# Altium footprint library NXP_60_26022015.PCBLIB: 287 footprints (part 15 of 18) (continued)
## SOT1087-1 [mm] (continued)
  rectangle: 0.1,0.6 0.4,0.9
  rectangle: -0.4,0.1 -0.1,0.4
  rectangle: 0.1,0.1 0.4,0.4
  rectangle: -0.4,-0.4 -0.1,-0.1
  rectangle: 0.1,-0.4 0.4,-0.1
  rectangle: -0.4,-0.9 -0.1,-0.6
  rectangle: 0.1,-0.9 0.4,-0.6
  rectangle: -0.4,-1.4 -0.1,-1.1
  rectangle: 0.1,-1.4 0.4,-1.1
  rectangle: -0.4,-1.9 -0.1,-1.6
  rectangle: 0.1,-1.9 0.4,-1.6
  rectangle: -0.4,-2.4 -0.1,-2.1
  rectangle: 0.1,-2.4 0.4,-2.1
  rectangle: 0.6,2.1 0.9,2.4
  rectangle: 1.1,2.1 1.4,2.4
  rectangle: 0.6,1.6 0.9,1.9
  rectangle: 1.1,1.6 1.4,1.9
  rectangle: 0.6,1.1 0.9,1.4
  rectangle: 1.1,1.1 1.4,1.4
  rectangle: 0.6,0.6 0.9,0.9
  rectangle: 1.1,0.6 1.4,0.9
  rectangle: 0.6,0.1 0.9,0.4
  rectangle: 1.1,0.1 1.4,0.4
  rectangle: 0.6,-0.4 0.9,-0.1
  rectangle: 1.1,-0.4 1.4,-0.1
  rectangle: 0.6,-0.9 0.9,-0.6
  rectangle: 1.1,-0.9 1.4,-0.6
  rectangle: 0.6,-1.4 0.9,-1.1
  rectangle: 1.1,-1.4 1.4,-1.1
  rectangle: 0.6,-1.9 0.9,-1.6
  rectangle: 1.1,-1.9 1.4,-1.6
  rectangle: 0.6,-2.4 0.9,-2.1
  rectangle: 1.1,-2.4 1.4,-2.1
  rectangle: 1.6,2.1 1.9,2.4
  rectangle: 2.1,2.1 2.4,2.4
  rectangle: 1.6,1.6 1.9,1.9
  rectangle: 2.1,1.6 2.4,1.9
  rectangle: 1.6,1.1 1.9,1.4
  rectangle: 2.1,1.1 2.4,1.4
  rectangle: 1.6,0.6 1.9,0.9
  rectangle: 2.1,0.6 2.4,0.9
  rectangle: 1.6,0.1 1.9,0.4
  rectangle: 2.1,0.1 2.4,0.4
  rectangle: 1.6,-0.4 1.9,-0.1
  rectangle: 2.1,-0.4 2.4,-0.1
  rectangle: 1.6,-0.9 1.9,-0.6
  rectangle: 2.1,-0.9 2.4,-0.6
  rectangle: 1.6,-1.4 1.9,-1.1
  rectangle: 2.1,-1.4 2.4,-1.1
  rectangle: 1.6,-1.9 1.9,-1.6
  rectangle: 2.1,-1.9 2.4,-1.6
  rectangle: 1.6,-2.4 1.9,-2.1
  rectangle: 2.1,-2.4 2.4,-2.1
Top Solder:
  circle w0: c-2.25,2.25 r0.213
  circle w0: c-1.75,2.25 r0.213
  circle w0: c-1.25,2.25 r0.213
  circle w0: c-0.75,2.25 r0.213
  circle w0: c-0.25,2.25 r0.213
  circle w0: c0.25,2.25 r0.213
  circle w0: c0.75,2.25 r0.213
  circle w0: c1.25,2.25 r0.213
  circle w0: c1.75,2.25 r0.213
  circle w0: c2.25,2.25 r0.213
  circle w0: c-2.25,1.75 r0.213
  circle w0: c-2.25,1.25 r0.213
  circle w0: c-2.25,0.75 r0.213
  circle w0: c-2.25,0.25 r0.213
  circle w0: c-2.25,-0.25 r0.213
  circle w0: c-2.25,-0.75 r0.213
  circle w0: c-2.25,-1.25 r0.213
  circle w0: c-2.25,-1.75 r0.213
  circle w0: c-2.25,-2.25 r0.213
  circle w0: c-1.75,1.75 r0.213
  circle w0: c-1.75,1.25 r0.213
  circle w0: c-1.75,0.75 r0.213
  circle w0: c-1.75,0.25 r0.213
  circle w0: c-1.75,-0.25 r0.213
  circle w0: c-1.75,-0.75 r0.213
  circle w0: c-1.75,-1.25 r0.213
  circle w0: c-1.75,-1.75 r0.213
  circle w0: c-1.75,-2.25 r0.213
  circle w0: c-1.25,1.75 r0.213
  circle w0: c-1.25,1.25 r0.213
  circle w0: c-1.25,0.75 r0.213
  circle w0: c-1.25,0.25 r0.213
  circle w0: c-1.25,-0.25 r0.213
  circle w0: c-1.25,-0.75 r0.213
  circle w0: c-1.25,-1.25 r0.213
  circle w0: c-1.25,-1.75 r0.213
  circle w0: c-1.25,-2.25 r0.213
  circle w0: c-0.75,1.75 r0.213
  circle w0: c-0.75,1.25 r0.213
  circle w0: c-0.75,0.75 r0.213
  circle w0: c-0.75,0.25 r0.213
  circle w0: c-0.75,-0.25 r0.213
  circle w0: c-0.75,-0.75 r0.213
  circle w0: c-0.75,-1.25 r0.213
  circle w0: c-0.75,-1.75 r0.213
  circle w0: c-0.75,-2.25 r0.213
  circle w0: c-0.25,1.75 r0.213
  circle w0: c-0.25,1.25 r0.213
  circle w0: c-0.25,0.75 r0.213
  circle w0: c-0.25,0.25 r0.213
  circle w0: c-0.25,-0.25 r0.213
  circle w0: c-0.25,-0.75 r0.213
  circle w0: c-0.25,-1.25 r0.213
  circle w0: c-0.25,-1.75 r0.213
  circle w0: c-0.25,-2.25 r0.213
  circle w0: c0.25,1.75 r0.213
  circle w0: c0.25,1.25 r0.213
  circle w0: c0.25,0.75 r0.213
  circle w0: c0.25,0.25 r0.213
  circle w0: c0.25,-0.25 r0.213
  circle w0: c0.25,-0.75 r0.213
  circle w0: c0.25,-1.25 r0.213
  circle w0: c0.25,-1.75 r0.213
  circle w0: c0.25,-2.25 r0.213
  circle w0: c0.75,1.75 r0.213
  circle w0: c0.75,1.25 r0.213
  circle w0: c0.75,0.75 r0.213
  circle w0: c0.75,0.25 r0.213
  circle w0: c0.75,-0.25 r0.213
  circle w0: c0.75,-0.75 r0.213
  circle w0: c0.75,-1.25 r0.213
  circle w0: c0.75,-1.75 r0.213
  circle w0: c0.75,-2.25 r0.213
  circle w0: c1.25,1.75 r0.213
  circle w0: c1.25,1.25 r0.213
  circle w0: c1.25,0.75 r0.213
  circle w0: c1.25,0.25 r0.213
  circle w0: c1.25,-0.25 r0.213
  circle w0: c1.25,-0.75 r0.213
  circle w0: c1.25,-1.25 r0.213
  circle w0: c1.25,-1.75 r0.213
  circle w0: c1.25,-2.25 r0.213
  circle w0: c1.75,1.75 r0.213
  circle w0: c1.75,1.25 r0.213
  circle w0: c1.75,0.75 r0.213
  circle w0: c1.75,0.25 r0.213
  circle w0: c1.75,-0.25 r0.213
  circle w0: c1.75,-0.75 r0.213
  circle w0: c1.75,-1.25 r0.213
  circle w0: c1.75,-1.75 r0.213
  circle w0: c1.75,-2.25 r0.213
  circle w0: c2.25,1.75 r0.213
  circle w0: c2.25,1.25 r0.213
  circle w0: c2.25,0.75 r0.213
  circle w0: c2.25,0.25 r0.213
  circle w0: c2.25,-0.25 r0.213
  circle w0: c2.25,-0.75 r0.213
  circle w0: c2.25,-1.25 r0.213
  circle w0: c2.25,-1.75 r0.213
  circle w0: c2.25,-2.25 r0.213
Mechanical 16:
  rectangle: -3,1.5 -1.5,3

## SOT1089-1 [mm]
pads (8):
  rect 0.15x0.5 smd: 1(-0.525,-0.35) 2(-0.175,-0.35) 3(0.175,-0.35) 4(0.525,-0.35) 5(0.525,0.35) 6(0.175,0.35) 7(-0.175,0.35) 8(-0.525,0.35)
Top Overlay:
  circle w0: c-0.7,-0.875 r0.2
Top Solder:
  rectangle: -0.65,-0.65 -0.4,-0.05
  rectangle: -0.3,-0.65 -0.05,-0.05
  rectangle: 0.05,-0.65 0.3,-0.05
  rectangle: 0.4,-0.65 0.65,-0.05
  rectangle: 0.4,0.05 0.65,0.65
  rectangle: 0.05,0.05 0.3,0.65
  rectangle: -0.3,0.05 -0.05,0.65
  rectangle: -0.65,0.05 -0.4,0.65
Mechanical 16:
  rectangle: -0.7,-0.525 0,0
  lines w0.127: -0.675,-0.5 0.675,-0.5 0.675,0.5 -0.675,0.5 -0.675,-0.5
  text "SOT1089-1" at -1,1 h0.17

## SOT1092-2 [mm]
pads (37):
  rect 0.9x0.29 smd: 1(-2.8,2) 2(-2.8,1.5) 3(-2.8,1) 4(-2.8,0.5) 5(-2.8,0) 6(-2.8,-0.5) 7(-2.8,-1) 8(-2.8,-1.5) 9(-2.8,-2) 19(2.8,-2) 20(2.8,-1.5) 21(2.8,-1) 22(2.8,-0.5) 23(2.8,0) 24(2.8,0.5) 25(2.8,1) 26(2.8,1.5) 27(2.8,2)
  rect 0.29x0.9 smd: 10(-2,-2.8) 11(-1.5,-2.8) 12(-1,-2.8) 13(-0.5,-2.8) 14(0,-2.8) 15(0.5,-2.8) 16(1,-2.8) 17(1.5,-2.8) 18(2,-2.8) 28(2,2.8) 29(1.5,2.8) 30(1,2.8) 31(0.5,2.8) 32(0,2.8) 33(-0.5,2.8) 34(-1,2.8) 35(-1.5,2.8) 36(-2,2.8)
  rect 3.9x3.9 smd: 41(0,0)
Top Overlay:
  circle w0: c-3.317,3.135 r0.224
Bottom Overlay:
  lines w0.127: -3,-2.5 -3,-3 -2.5,-3 ; -3,2.5 -3,3 -2.5,3 ; 2.5,-3 3,-3 3,-2.5 ; 2.5,3 3,3 3,2.5
Top Paste:
  rectangle: -0.3,-0.3 0.3,0.3
  rectangle: 0.6,-0.3 1.2,0.3
  rectangle: -1.2,-0.3 -0.6,0.3
  rectangle: -1.2,0.6 -0.6,1.2
  rectangle: -0.3,0.6 0.3,1.2
  rectangle: 0.6,0.6 1.2,1.2
  rectangle: -1.2,-1.2 -0.6,-0.6
  rectangle: -0.3,-1.2 0.3,-0.6
  rectangle: 0.6,-1.2 1.2,-0.6
Mechanical 16:
  lines w0.127: -3,-3 3,-3 3,3 -3,3 -3,-3

## SOT1115 [mm]
pads (6):
  rect 0.22x0.325 smd: 1(-0.3,-0.312) 2(0,-0.312) 3(0.3,-0.312) 4(0.3,0.312) 5(0,0.312) 6(-0.3,0.312)
Top Overlay:
  lines w0.127: -0.75,-0.25 -0.75,-0.75 -0.25,-0.75
Top Solder:
  rectangle: -0.15,0.11 0.15,0.515
  rectangle: -0.15,-0.515 0.15,-0.11
  rectangle: -0.45,-0.515 -0.15,-0.11
  rectangle: -0.45,0.11 -0.15,0.515
  rectangle: 0.15,0.11 0.45,0.515
  rectangle: 0.15,-0.515 0.45,-0.11
Mechanical 16:
  rectangle: -0.45,-0.5 0,0
  lines w0.127: -0.45,-0.5 0.45,-0.5 0.45,0.5 -0.45,0.5 -0.45,-0.5
  text "SOT1115" at -0.75,0.625 h0.17

## SOT1118 [mm]
pads (8):
  rect 0.35x0.3 smd: 1(-0.65,-0.875) 2(0,-0.875) 3(0.65,-0.875) 4(0.65,0.875) 5(0,0.875) 6(-0.65,0.875)
  rect 0.72x1.05 smd: 7(-0.49,0) 8(0.49,0)
Top Overlay:
  circle w0: c-1,-1.5 r0.2
  lines w0.1: -1,-1 -1,1 ; 1,-1 1,1
Top Solder:
  rectangle: -0.9,-0.575 -0.08,0.575
  rectangle: 0.08,-0.575 0.9,0.575
  rectangle: -0.225,-1.075 0.225,-0.675
  rectangle: 0.425,-1.075 0.875,-0.675
  rectangle: -0.875,-1.075 -0.425,-0.675
  rectangle: -0.225,0.675 0.225,1.075
  rectangle: 0.425,0.675 0.875,1.075
  rectangle: -0.875,0.675 -0.425,1.075
Mechanical 16:
  rectangle: -1,-1 0,0
  lines w0.1: -1,-1 1,-1 1,1 -1,1 -1,-1
  text "SOT1118" at -0.625,-1.375 h0.17

## SOT1122 [mm]
pads (3):
  rect 0.3x0.6 smd: 1(-0.275,-0.475) 2(0.275,-0.475)
  rect 0.55x0.55 smd: 3(0,0.45)
Top Overlay:
  circle w0: c-0.45,-1.225 r0.2
Top Solder:
  rectangle: -0.325,0.125 0.325,0.775
  rectangle: -0.475,-0.825 -0.075,-0.125
  rectangle: 0.075,-0.825 0.475,-0.125
Mechanical 16:
  rectangle: -0.5,-0.75 0,0
  lines w0.127: -0.5,-0.75 -0.5,0.75 0.5,0.75 0.5,-0.75 -0.5,-0.75
  text "SOT1122" at -0.625,1.1 h0.17

## SOT1133-1 [mm]
pads (61):
  rect 0.275x0.45 smd: A1(-1.75,-2.335) A2(-1.25,-2.335) A3(-0.75,-2.335) A4(-0.25,-2.335) A5(0.25,-2.335) A6(0.75,-2.335) A7(1.25,-2.335) A8(1.75,-2.335) A17(1.75,2.335) A18(1.25,2.335) A19(0.75,2.335) A20(0.25,2.335) A21(-0.25,2.335) A22(-0.75,2.335) A23(-1.25,2.335) A24(-1.75,2.335) D1(-2.275,-2.335) D2(2.275,-2.335) D3(2.275,2.335) D4(-2.275,2.335)
  rect 0.45x0.275 smd: A9(2.335,-1.75) A10(2.335,-1.25) A11(2.335,-0.75) A12(2.335,-0.25) A13(2.335,0.25) A14(2.335,0.75) A15(2.335,1.25) A16(2.335,1.75) A25(-2.335,1.75) A26(-2.335,1.25) A27(-2.335,0.75) A28(-2.335,0.25) A29(-2.335,-0.25) A30(-2.335,-0.75) A31(-2.335,-1.25) A32(-2.335,-1.75)
  rect 0.33x0.33 smd: B1(-1,-1.775) B2(-0.5,-1.775) B3(0,-1.775) B4(0.5,-1.775) B5(1,-1.775) B6(1.775,-1) B7(1.775,-0.5) B8(1.775,0) B9(1.775,0.5) B10(1.775,1) B11(1,1.775) B12(0.5,1.775) B13(0,1.775) B14(-0.5,1.775) B15(-1,1.775) B16(-1.775,1) B17(-1.775,0.5) B18(-1.775,0) B19(-1.775,-0.5) B20(-1.775,-1) D5(-1.775,-1.775) D6(1.775,-1.775) D7(1.775,1.775) D8(-1.775,1.775)
  rect 2.6x2.6 smd: CP(0,0)
Top Overlay:
  lines w0.127: -2.75,-2 -2.75,-2.75 -2,-2.75
Top Paste:
  rectangle: 0.125,0.125 0.525,0.525
  rectangle: 0.125,-0.525 0.525,-0.125
  rectangle: -0.525,0.125 -0.125,0.525
  rectangle: -0.525,-0.525 -0.125,-0.125
  rectangle: 0.775,0.125 1.175,0.525
  rectangle: 0.775,-0.525 1.175,-0.125
  rectangle: 0.125,-1.175 0.525,-0.775
  rectangle: -0.525,-1.175 -0.125,-0.775
  rectangle: 0.125,0.775 0.525,1.175
  rectangle: -0.525,0.775 -0.125,1.175
  rectangle: -1.175,0.125 -0.775,0.525
  rectangle: -1.175,-0.525 -0.775,-0.125
  rectangle: -1.175,0.775 -0.775,1.175
  rectangle: -1.175,-1.175 -0.775,-0.775
  rectangle: 0.775,-1.175 1.175,-0.775
  rectangle: 0.775,0.775 1.175,1.175
Top Solder:
  rectangle: 1.573,-0.202 1.977,0.202
  rectangle: 1.573,0.297 1.977,0.703
  rectangle: 1.573,0.798 1.977,1.202
  rectangle: 1.573,-0.703 1.977,-0.297
  rectangle: 1.573,-1.202 1.977,-0.798
  region: -1.573,0.202 -1.977,0.202 -1.977,-0.202 -1.573,-0.202
  region: -1.573,-0.297 -1.977,-0.297 -1.977,-0.703 -1.573,-0.703
  region: -1.573,-0.798 -1.977,-0.798 -1.977,-1.202 -1.573,-1.202
  region: -1.573,0.703 -1.977,0.703 -1.977,0.297 -1.573,0.297
  region: -1.573,1.202 -1.977,1.202 -1.977,0.798 -1.573,0.798
  region: -0.202,-1.573 -0.202,-1.977 0.202,-1.977 0.202,-1.573
  region: 0.298,-1.572 0.298,-1.978 0.702,-1.978 0.702,-1.572
  region: 0.798,-1.573 0.798,-1.977 1.202,-1.977 1.202,-1.573
  region: -0.702,-1.572 -0.702,-1.978 -0.298,-1.978 -0.298,-1.572
  region: -1.202,-1.573 -1.202,-1.977 -0.798,-1.977 -0.798,-1.573
  region: 0.202,1.573 0.202,1.977 -0.202,1.977 -0.202,1.573
  region: -0.298,1.572 -0.298,1.978 -0.702,1.978 -0.702,1.572
  region: -0.798,1.573 -0.798,1.977 -1.202,1.977 -1.202,1.573
  region: 0.702,1.572 0.702,1.978 0.298,1.978 0.298,1.572
  region: 1.202,1.573 1.202,1.977 0.798,1.977 0.798,1.573
  rectangle: 1.573,1.573 1.977,1.977
  rectangle: -1.977,1.573 -1.573,1.977
  rectangle: -1.977,-1.977 -1.573,-1.573
  rectangle: 1.573,-1.977 1.977,-1.573
  rectangle: 2.072,-0.425 2.597,-0.075
  rectangle: 2.072,0.075 2.597,0.425
  rectangle: 2.072,0.575 2.597,0.925
  rectangle: 2.072,1.075 2.597,1.425
  rectangle: 2.072,1.575 2.597,1.925
  rectangle: 2.072,-0.925 2.597,-0.575
  rectangle: 2.072,-1.425 2.597,-1.075
  rectangle: 2.072,-1.925 2.597,-1.575
  region: 0.425,2.073 0.425,2.598 0.075,2.598 0.075,2.073
  region: -0.075,2.073 -0.075,2.598 -0.425,2.598 -0.425,2.073
  region: -0.575,2.073 -0.575,2.598 -0.925,2.598 -0.925,2.073
  region: -1.075,2.073 -1.075,2.598 -1.425,2.598 -1.425,2.073
  region: -1.575,2.073 -1.575,2.598 -1.925,2.598 -1.925,2.073
  region: 0.925,2.073 0.925,2.598 0.575,2.598 0.575,2.073
  region: 1.425,2.073 1.425,2.598 1.075,2.598 1.075,2.073
  region: 1.925,2.073 1.925,2.598 1.575,2.598 1.575,2.073
  region: -0.425,-2.073 -0.425,-2.598 -0.075,-2.598 -0.075,-2.073
  region: 0.075,-2.073 0.075,-2.598 0.425,-2.598 0.425,-2.073
  region: 0.575,-2.073 0.575,-2.598 0.925,-2.598 0.925,-2.073
  region: 1.075,-2.073 1.075,-2.598 1.425,-2.598 1.425,-2.073
  region: 1.575,-2.073 1.575,-2.598 1.925,-2.598 1.925,-2.073
  region: -0.925,-2.073 -0.925,-2.598 -0.575,-2.598 -0.575,-2.073
  region: -1.425,-2.073 -1.425,-2.598 -1.075,-2.598 -1.075,-2.073
  region: -1.925,-2.073 -1.925,-2.598 -1.575,-2.598 -1.575,-2.073
  region: -2.072,0.425 -2.597,0.425 -2.597,0.075 -2.072,0.075
  region: -2.072,-0.075 -2.597,-0.075 -2.597,-0.425 -2.072,-0.425
  region: -2.072,-0.575 -2.597,-0.575 -2.597,-0.925 -2.072,-0.925
  region: -2.072,-1.075 -2.597,-1.075 -2.597,-1.425 -2.072,-1.425
  region: -2.072,-1.575 -2.597,-1.575 -2.597,-1.925 -2.072,-1.925
  region: -2.072,0.925 -2.597,0.925 -2.597,0.575 -2.072,0.575
  region: -2.072,1.425 -2.597,1.425 -2.597,1.075 -2.072,1.075
  region: -2.072,1.925 -2.597,1.925 -2.597,1.575 -2.072,1.575
  rectangle: 2.1,-2.597 2.45,-2.072
  region: 2.45,2.597 2.1,2.597 2.1,2.072 2.45,2.072
  region: -2.1,2.597 -2.45,2.597 -2.45,2.072 -2.1,2.072
  rectangle: -2.45,-2.597 -2.1,-2.072
  rectangle: -1.338,-1.338 1.338,1.338
Mechanical 16:
  rectangle: -2.5,-2.5 0,0
  lines w0.127: -2.5,-2.5 2.5,-2.5 2.5,2.5 -2.5,2.5 -2.5,-2.5

## SOT1134-1 [mm]
pads (61):
  rect 0.45x0.275 smd: A1(-1.835,2.25) A2(-1.835,1.75) A3(-1.835,1.25) A4(-1.835,0.75) A5(-1.835,0.25) A6(-1.835,-0.25) A7(-1.835,-0.75) A8(-1.835,-1.25) A9(-1.835,-1.75) A10(-1.835,-2.25) A17(1.835,-2.25) A18(1.835,-1.75) A19(1.835,-1.25) A20(1.835,-0.75) A21(1.835,-0.25) A22(1.835,0.25) A23(1.835,0.75) A24(1.835,1.25) A25(1.835,1.75) A26(1.835,2.25) D1(-1.835,2.775) D2(-1.835,-2.775) D3(1.835,-2.775) D4(1.835,2.775)
  rect 0.275x0.45 smd: A11(-1.25,-2.835) A12(-0.75,-2.835) A13(-0.25,-2.835) A14(0.25,-2.835) A15(0.75,-2.835) A16(1.25,-2.835) A27(1.25,2.835) A28(0.75,2.835) A29(0.25,2.835) A30(-0.25,2.835) A31(-0.75,2.835) A32(-1.25,2.835)
  rect 0.33x0.33 smd: B1(-1.275,1.5) B2(-1.275,1) B3(-1.275,0.5) B4(-1.275,0) B5(-1.275,-0.5) B6(-1.275,-1) B7(-1.275,-1.5) B8(-0.5,-2.275) B9(0,-2.275) B10(0.5,-2.275) B11(1.275,-1.5) B12(1.275,-1) B13(1.275,-0.5) B14(1.275,0) B15(1.275,0.5) B16(1.275,1) B17(1.275,1.5) B18(0.5,2.275) B19(0,2.275) B20(-0.5,2.275) D5(-1.275,2.275) D6(-1.275,-2.275) D7(1.275,-2.275) D8(1.275,2.275)
  rect 1.6x3 smd: CP(0,0)
Top Overlay:
  lines w0.127: -2.25,2.5 -2.25,3.25 -1.5,3.25
Top Paste:
  rectangle: -0.45,-0.175 -0.1,0.175
  rectangle: 0.1,-0.175 0.45,0.175
  rectangle: -0.45,0.375 -0.1,0.725
  rectangle: 0.1,0.375 0.45,0.725
  rectangle: -0.45,-0.725 -0.1,-0.375
  rectangle: 0.1,-0.725 0.45,-0.375
  rectangle: -0.45,0.925 -0.1,1.275
  rectangle: 0.1,0.925 0.45,1.275
  rectangle: -0.45,-1.275 -0.1,-0.925
  rectangle: 0.1,-1.275 0.45,-0.925
Top Solder:
  rectangle: 1.072,-0.202 1.478,0.202
  rectangle: 1.072,0.297 1.478,0.703
  rectangle: 1.072,0.798 1.478,1.202
  rectangle: 1.072,-0.703 1.478,-0.297
  rectangle: 1.072,-1.202 1.478,-0.798
  rectangle: 1.072,-1.703 1.478,-1.297
  rectangle: 1.072,1.297 1.478,1.703
  rectangle: -1.478,1.297 -1.072,1.703
  rectangle: -1.478,0.798 -1.072,1.202
  rectangle: -1.478,0.297 -1.072,0.703
  rectangle: -1.478,-0.202 -1.072,0.202
  rectangle: -1.478,-0.703 -1.072,-0.297
  rectangle: -1.478,-1.202 -1.072,-0.798
  rectangle: -1.478,-1.703 -1.072,-1.297
  rectangle: 1.072,2.072 1.478,2.478
  rectangle: 0.297,2.072 0.703,2.478
  rectangle: -0.202,2.072 0.202,2.478
  rectangle: -0.703,2.072 -0.297,2.478
  rectangle: -1.478,2.072 -1.072,2.478
  region: -1.072,-2.072 -1.478,-2.072 -1.478,-2.478 -1.072,-2.478
  region: -0.297,-2.072 -0.703,-2.072 -0.703,-2.478 -0.297,-2.478
  region: 0.202,-2.072 -0.202,-2.072 -0.202,-2.478 0.202,-2.478
  region: 0.703,-2.072 0.297,-2.072 0.297,-2.478 0.703,-2.478
  region: 1.478,-2.072 1.072,-2.072 1.072,-2.478 1.478,-2.478
  rectangle: 1.573,0.575 2.098,0.925
  rectangle: 1.573,0.075 2.098,0.425
  rectangle: 1.573,-0.425 2.098,-0.075
  rectangle: 1.573,-0.925 2.098,-0.575
  rectangle: 1.573,-1.425 2.098,-1.075
  rectangle: 1.573,-1.925 2.098,-1.575
  rectangle: 1.573,1.075 2.098,1.425
  rectangle: 1.573,1.575 2.098,1.925
  rectangle: 1.573,2.075 2.098,2.425
  rectangle: 1.573,-2.425 2.098,-2.075
  rectangle: 1.573,2.6 2.098,2.95
  rectangle: 1.573,-2.95 2.098,-2.6
  region: -1.573,-0.575 -2.098,-0.575 -2.098,-0.925 -1.573,-0.925
  region: -1.573,-0.075 -2.098,-0.075 -2.098,-0.425 -1.573,-0.425
  region: -1.573,0.425 -2.098,0.425 -2.098,0.075 -1.573,0.075
  region: -1.573,0.925 -2.098,0.925 -2.098,0.575 -1.573,0.575
  region: -1.573,1.425 -2.098,1.425 -2.098,1.075 -1.573,1.075
  region: -1.573,1.925 -2.098,1.925 -2.098,1.575 -1.573,1.575
  region: -1.573,-1.075 -2.098,-1.075 -2.098,-1.425 -1.573,-1.425
  region: -1.573,-1.575 -2.098,-1.575 -2.098,-1.925 -1.573,-1.925
  region: -1.573,-2.075 -2.098,-2.075 -2.098,-2.425 -1.573,-2.425
  region: -1.573,2.425 -2.098,2.425 -2.098,2.075 -1.573,2.075
  region: -1.573,-2.6 -2.098,-2.6 -2.098,-2.95 -1.573,-2.95
  region: -1.573,2.95 -2.098,2.95 -2.098,2.6 -1.573,2.6
  rectangle: 0.075,2.573 0.425,3.098
  rectangle: -0.425,2.573 -0.075,3.098
  rectangle: -0.925,2.573 -0.575,3.098
  rectangle: 0.575,2.573 0.925,3.098
  rectangle: 1.075,2.573 1.425,3.098
  rectangle: -1.425,2.573 -1.075,3.098
  region: -0.075,-2.573 -0.425,-2.573 -0.425,-3.098 -0.075,-3.098
  region: 0.425,-2.573 0.075,-2.573 0.075,-3.098 0.425,-3.098
  region: 0.925,-2.573 0.575,-2.573 0.575,-3.098 0.925,-3.098
  region: -0.575,-2.573 -0.925,-2.573 -0.925,-3.098 -0.575,-3.098
  region: -1.075,-2.573 -1.425,-2.573 -1.425,-3.098 -1.075,-3.098
  region: 1.425,-2.573 1.075,-2.573 1.075,-3.098 1.425,-3.098
  rectangle: -0.837,-1.537 0.837,1.537
Mechanical 16:
  rectangle: -2,0 0,3
  lines w0.127: -2,-3 2,-3 2,3 -2,3 -2,-3
  text "SOT1134-1" at -0.75,-1.875 h0.17

## SOT1134-2 [mm]
pads (61):
  rect 0.3x0.3 smd: A1(-1.75,2.25) A2(-1.75,1.75) A3(-1.75,1.25) A4(-1.75,0.75) A5(-1.75,0.25) A6(-1.75,-0.25) A7(-1.75,-0.75) A8(-1.75,-1.25) A9(-1.75,-1.75) A10(-1.75,-2.25) A11(-1.25,-2.75) A12(-0.75,-2.75) A13(-0.25,-2.75) A14(0.25,-2.75) A15(0.75,-2.75) A16(1.25,-2.75) A17(1.75,-2.25) A18(1.75,-1.75) A19(1.75,-1.25) A20(1.75,-0.75) A21(1.75,-0.25) A22(1.75,0.25) A23(1.75,0.75) A24(1.75,1.25) A25(1.75,1.75) A26(1.75,2.25) A27(1.25,2.75) A28(0.75,2.75) A29(0.25,2.75) A30(-0.25,2.75) A31(-0.75,2.75) A32(-1.25,2.75) B1(-1.25,1.5) B2(-1.25,1) B3(-1.25,0.5) B4(-1.25,0) B5(-1.25,-0.5) B6(-1.25,-1) B7(-1.25,-1.5) B8(-0.5,-2.25) B9(0,-2.25) B10(0.5,-2.25) B11(1.25,-1.5) B12(1.25,-1) B13(1.25,-0.5) B14(1.25,0) B15(1.25,0.5) B16(1.25,1) B17(1.25,1.5) B18(0.5,2.25) B19(0,2.25) B20(-0.5,2.25) D1(-1.75,2.75) D2(-1.75,-2.75) D3(1.75,-2.75) D4(1.75,2.75) D5(-1.25,2.25) D6(-1.25,-2.25) D7(1.25,-2.25) D8(1.25,2.25)
  rect 1.9x3.9 smd: CP(0,0)
Top Overlay:
  lines w0.127: -2.25,2.5 -2.25,3.25 -1.5,3.25
Top Paste:
  rectangle: -0.55,0.175 0.55,1.275
  rectangle: -0.55,-1.275 0.55,-0.175
Top Solder:
  rectangle: 1.05,0.8 1.45,1.2
  rectangle: 1.55,-1.95 1.95,-1.55
  rectangle: 1.05,-1.7 1.45,-1.3
  rectangle: 1.05,-1.2 1.45,-0.8
  rectangle: 1.55,-0.95 1.95,-0.55
  rectangle: 1.55,-1.45 1.95,-1.05
  rectangle: 1.05,-0.7 1.45,-0.3
  rectangle: 1.55,-0.45 1.95,-0.05
  rectangle: 1.05,-0.2 1.45,0.2
  rectangle: 1.05,-2.45 1.45,-2.05
  rectangle: 1.55,-2.45 1.95,-2.05
  rectangle: 1.55,-2.95 1.95,-2.55
  rectangle: 1.05,-2.95 1.45,-2.55
  rectangle: 0.55,-2.95 0.95,-2.55
  rectangle: 0.3,-2.45 0.7,-2.05
  rectangle: 1.05,0.3 1.45,0.7
  rectangle: 1.55,0.05 1.95,0.45
  rectangle: 1.55,0.55 1.95,0.95
  rectangle: 1.55,1.05 1.95,1.45
  rectangle: 1.05,1.3 1.45,1.7
  rectangle: 1.05,2.05 1.45,2.45
  rectangle: 1.55,1.55 1.95,1.95
  rectangle: 1.55,2.05 1.95,2.45
  rectangle: 1.55,2.55 1.95,2.95
  rectangle: 1.05,2.55 1.45,2.95
  rectangle: 0.55,2.55 0.95,2.95
  rectangle: 0.3,2.05 0.7,2.45
  rectangle: -0.2,2.05 0.2,2.45
  rectangle: -0.7,2.05 -0.3,2.45
  rectangle: -1.45,2.05 -1.05,2.45
  rectangle: -1.45,1.3 -1.05,1.7
  rectangle: -1.45,0.8 -1.05,1.2
  rectangle: -1.45,0.3 -1.05,0.7
  rectangle: -1.45,-0.2 -1.05,0.2
  rectangle: -1.95,0.05 -1.55,0.45
  rectangle: -1.95,0.55 -1.55,0.95
  rectangle: -1.95,1.05 -1.55,1.45
  rectangle: -1.95,1.55 -1.55,1.95
  rectangle: -1.95,2.05 -1.55,2.45
  rectangle: -1.95,2.55 -1.55,2.95
  rectangle: -1.45,2.55 -1.05,2.95
  rectangle: -0.95,2.55 -0.55,2.95
  rectangle: -0.45,2.55 -0.05,2.95
  rectangle: 0.05,2.55 0.45,2.95
  rectangle: -1.95,-0.45 -1.55,-0.05
  rectangle: -1.95,-0.95 -1.55,-0.55
  rectangle: -1.95,-1.45 -1.55,-1.05
  rectangle: -1.45,-0.7 -1.05,-0.3
  rectangle: -1.45,-1.2 -1.05,-0.8
  rectangle: -1.45,-1.7 -1.05,-1.3
  rectangle: -1.95,-1.95 -1.55,-1.55
  rectangle: -1.95,-2.45 -1.55,-2.05
  rectangle: -1.45,-2.45 -1.05,-2.05
  rectangle: -1.95,-2.95 -1.55,-2.55
  rectangle: -1.45,-2.95 -1.05,-2.55
  rectangle: -0.95,-2.95 -0.55,-2.55
  rectangle: -0.45,-2.95 -0.05,-2.55
  rectangle: 0.05,-2.95 0.45,-2.55
  rectangle: -0.2,-2.45 0.2,-2.05
  rectangle: -0.7,-2.45 -0.3,-2.05
  rectangle: -1,-2 1,2
Mechanical 16:
  rectangle: -2,0 0,3
  lines w0.127: -2,-3 2,-3 2,3 -2,3 -2,-3
  text "SOT1134-2" at -0.75,-1.875 h0.17

## SOT1155-2 [mm]
pads (48):
  rrect100% 0.225x0.225 smd: A1(-1.75,1.75) A2(-1.25,1.75) A3(-0.75,1.75) A4(-0.25,1.75) A5(0.25,1.75) A6(0.75,1.75) A7(1.25,1.75) A8(1.75,1.75) B1(-1.75,1.25) B2(-1.25,1.25) B3(-0.75,1.25) B4(-0.25,1.25) B5(0.25,1.25) B6(0.75,1.25) B7(1.25,1.25) B8(1.75,1.25) C1(-1.75,0.75) C2(-1.25,0.75) C7(1.25,0.75) C8(1.75,0.75) D1(-1.75,0.25) D2(-1.25,0.25) D7(1.25,0.25) D8(1.75,0.25) E1(-1.75,-0.25) E2(-1.25,-0.25) E7(1.25,-0.25) E8(1.75,-0.25) F1(-1.75,-0.75) F2(-1.25,-0.75) F7(1.25,-0.75) F8(1.75,-0.75) G1(-1.75,-1.25) G2(-1.25,-1.25) G3(-0.75,-1.25) G4(-0.25,-1.25) G5(0.25,-1.25) G6(0.75,-1.25) G7(1.25,-1.25) G8(1.75,-1.25) H1(-1.75,-1.75) H2(-1.25,-1.75) H3(-0.75,-1.75) H4(-0.25,-1.75) H5(0.25,-1.75) H6(0.75,-1.75) H7(1.25,-1.75) H8(1.75,-1.75)
Top Overlay:
  lines w0.127: -2.5,1 -2.5,2.5 -1,2.5 ; -2.25,-2.25 -2.25,2.25 2.25,2.25 2.25,-2.25 -2.25,-2.25
Top Paste:
  drawing of 48 lines, arcs and shapes, not listed
Top Solder:
  circle w0: c-1.75,1.75 r0.163
  circle w0: c-1.25,1.75 r0.163
  circle w0: c-1.75,1.25 r0.163
  circle w0: c-1.25,1.25 r0.163
  circle w0: c-1.75,0.75 r0.163
  circle w0: c-1.25,0.75 r0.163
  circle w0: c-1.75,0.25 r0.163
  circle w0: c-1.25,0.25 r0.163
  circle w0: c-1.75,-0.25 r0.163
  circle w0: c-1.25,-0.25 r0.163
  circle w0: c-1.75,-0.75 r0.163
  circle w0: c-1.25,-0.75 r0.163
  circle w0: c-1.75,-1.25 r0.163
  circle w0: c-1.25,-1.25 r0.163
  circle w0: c-1.75,-1.75 r0.163
  circle w0: c-1.25,-1.75 r0.163
  circle w0: c-0.75,1.75 r0.163
  circle w0: c-0.25,1.75 r0.163
  circle w0: c-0.75,1.25 r0.163
  circle w0: c-0.25,1.25 r0.163
  circle w0: c0.25,1.75 r0.163
  circle w0: c0.75,1.75 r0.163
  circle w0: c0.25,1.25 r0.163
  circle w0: c0.75,1.25 r0.163
  circle w0: c-0.75,-1.25 r0.163
  circle w0: c-0.25,-1.25 r0.163
  circle w0: c-0.75,-1.75 r0.163
  circle w0: c-0.25,-1.75 r0.163
  circle w0: c0.25,-1.25 r0.163
  circle w0: c0.75,-1.25 r0.163
  circle w0: c0.25,-1.75 r0.163
  circle w0: c0.75,-1.75 r0.163
  circle w0: c1.25,1.75 r0.163
  circle w0: c1.75,1.75 r0.163
  circle w0: c1.25,1.25 r0.163
  circle w0: c1.75,1.25 r0.163
  circle w0: c1.25,0.75 r0.163
  circle w0: c1.75,0.75 r0.163
  circle w0: c1.25,0.25 r0.163
  circle w0: c1.75,0.25 r0.163
  circle w0: c1.25,-0.25 r0.163
  circle w0: c1.75,-0.25 r0.163
  circle w0: c1.25,-0.75 r0.163
  circle w0: c1.75,-0.75 r0.163
  circle w0: c1.25,-1.25 r0.163
  circle w0: c1.75,-1.25 r0.163
  circle w0: c1.25,-1.75 r0.163
  circle w0: c1.75,-1.75 r0.163
Mechanical 16:
  region: -2.25,2.25 -2.25,0.75 -0.75,0.75 -0.75,2.25

## SOT1160-1 [mm]
pads (10):
  rect 0.65x0.22 smd: 1(-0.525,0.2)
  rect 0.55x0.22 smd: 2(-0.575,-0.2) 6(0.575,-0.2) 7(0.575,0.2)
  rect 0.22x0.55 smd: 3(-0.4,-1) 4(0,-1) 5(0.4,-1) 8(0.4,1) 9(0,1) 10(-0.4,1)
Top Overlay:
  circle w0: c-1.2,0.2 r0.2
  lines w0.127: -0.7,-0.9 -0.7,-0.5 ; -0.7,0.5 -0.7,0.9 ; 0.7,-0.9 0.7,-0.5 ; 0.7,0.5 0.7,0.9
Top Paste:
  rectangle: -0.09,-1.255 0.09,-0.745
  rectangle: -0.49,-1.255 -0.31,-0.745
  rectangle: 0.31,-1.255 0.49,-0.745
  rectangle: -0.09,0.745 0.09,1.255
  rectangle: -0.49,0.745 -0.31,1.255
  rectangle: 0.31,0.745 0.49,1.255
  rectangle: -0.83,0.11 -0.22,0.29
  region: 0.83,0.29 0.32,0.29 0.32,0.11 0.83,0.11
  region: 0.83,-0.11 0.32,-0.11 0.32,-0.29 0.83,-0.29
  rectangle: -0.83,-0.29 -0.32,-0.11
Top Solder:
  rectangle: -0.172,-1.338 0.172,-0.662
  rectangle: 0.228,-1.338 0.573,-0.662
  rectangle: -0.573,-1.338 -0.228,-0.662
  rectangle: -0.172,0.662 0.172,1.338
  rectangle: 0.228,0.662 0.573,1.338
  rectangle: -0.573,0.662 -0.228,1.338
  rectangle: -0.913,-0.373 -0.237,-0.027
  rectangle: -0.913,0.027 -0.137,0.373
  region: 0.913,0.373 0.237,0.373 0.237,0.027 0.913,0.027
  region: 0.913,-0.027 0.237,-0.027 0.237,-0.373 0.913,-0.373
Mechanical 16:
  rectangle: -0.7,0 0,0.9
  lines w0.127: -0.7,-0.9 0.7,-0.9 0.7,0.9 -0.7,0.9 -0.7,-0.9
  text "SOT1160-1" at -0.75,-1.625 h0.17

## SOT1161-1 [mm]
pads (16):
  rect 0.65x0.22 smd: 1(-0.725,0.6)
  rect 0.55x0.22 smd: 2(-0.775,0.2) 3(-0.775,-0.2) 4(-0.775,-0.6) 9(0.775,-0.6) 10(0.775,-0.2) 11(0.775,0.2) 12(0.775,0.6)
  rect 0.22x0.55 smd: 5(-0.6,-1.175) 6(-0.2,-1.175) 7(0.2,-1.175) 8(0.6,-1.175) 13(0.6,1.175) 14(0.2,1.175) 15(-0.2,1.175) 16(-0.6,1.175)
Top Overlay:
  lines w0.127: -1.25,0.75 -1.25,1 -1.25,1.75 -0.25,1.75
Mechanical 16:
  rectangle: -1,0 0,1.4
  lines w0.127: -1.05,-1.45 1.05,-1.45 1.05,1.45 -1.05,1.45 -1.05,-1.45
  text "SOT1161-1" at -0.625,-1.875 h0.17